# Altium footprint library PcbLib1.PcbLib: 120 footprints (part 5 of 8)
Each footprint in its own frame and in the unit in brackets; x right, y up, seen from the top. Pads: shape width x height; smd on the part's side, far side on the other; paste and mask are expansions set on the pad; w line width, h text height; cw(c..) or ccw(c..) is an arc to the next point about the centre after c.
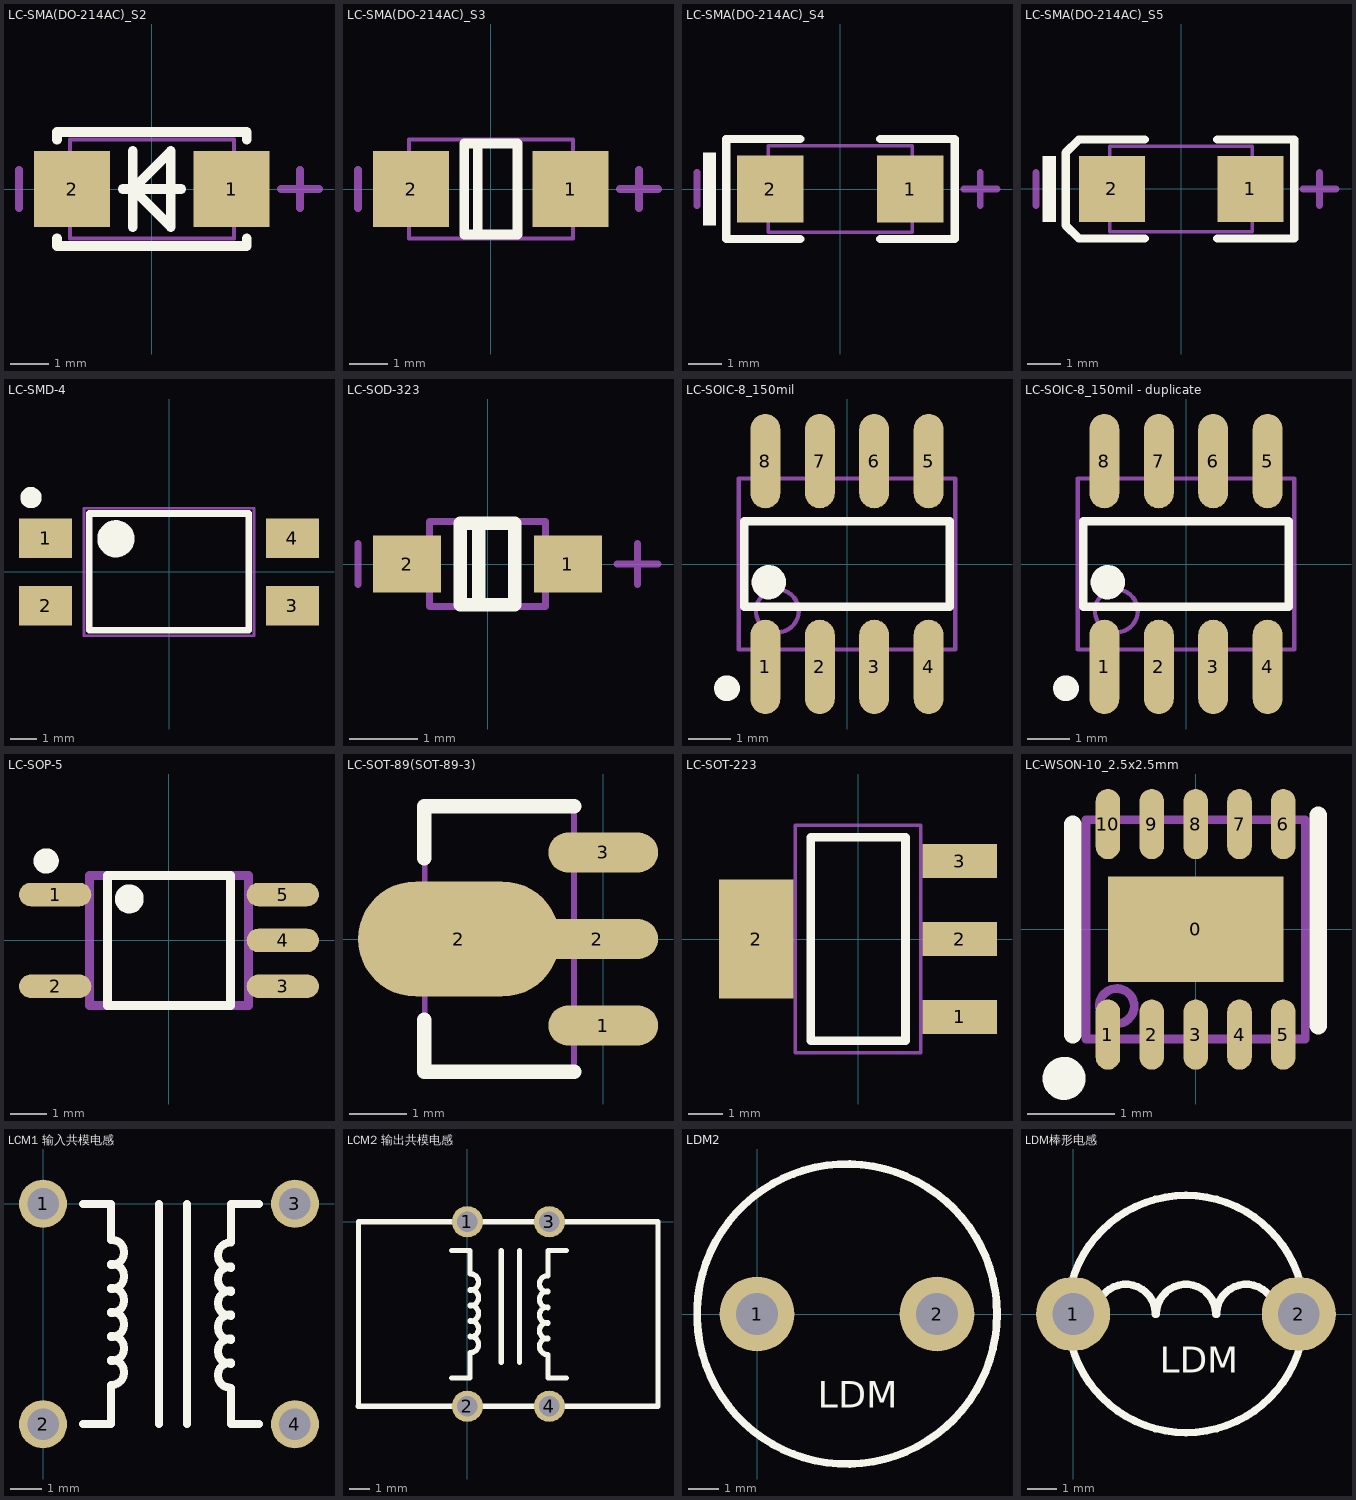
[diagram p4: the footprints below, top view; thin cyan lines are the x and y axes]

## LC-SMA(DO-214AC)_S2 [mm]
pads (2):
  rect 2x2 smd: 1(2.1,0) 2(-2.1,0)
Top Overlay:
  lines w0.254: -2.5,-1.3 -2.5,-1.5 2.5,-1.5 2.5,-1.3 ; -2.5,1.3 -2.5,1.5 2.5,1.5 2.5,1.3 ; -0.77,0 0.77,0 ; -0.5,-1 -0.5,1 ; -0.5,0 0.5,1 0.5,-1 -0.5,0
Mechanical 13:
  lines w0.1: -2.16,-1.3 -2.16,1.3 2.16,1.3 2.16,-1.3 -2.16,-1.3
Mechanical 15:
  lines w0.203: -3.5,-0.5 -3.5,0.5 ; 3.4,0 4.4,0 ; 3.9,-0.5 3.9,0.5

## LC-SMA(DO-214AC)_S3 [mm]
pads (2):
  rect 2x2 smd: 1(2.1,0) 2(-2.1,0)
Top Overlay:
  lines w0.254: -0.35,-1.2 -0.35,1.2 ; -0.7,-1.2 0.7,-1.2 0.7,1.2 -0.7,1.2 -0.7,-1.2
Mechanical 13:
  lines w0.1: -2.16,-1.3 2.16,-1.3 2.16,1.3 -2.16,1.3 -2.16,-1.3
Mechanical 15:
  lines w0.203: -3.5,-0.5 -3.5,0.5 ; 3.4,0 4.4,0 ; 3.9,-0.5 3.9,0.5

## LC-SMA(DO-214AC)_S4 [mm]
pads (2):
  rect 2x2 smd: 1(2.1,0) 2(-2.1,0)
Top Overlay:
  rectangle: -4.125,-1.1 -3.725,1.1
  lines w0.254: -3.43,1.5 -1.2,1.5 ; -3.429,1.5 -3.429,-1.5 -1.199,-1.5 ; 1.201,-1.5 3.431,-1.5 3.431,1.5 1.201,1.5
Mechanical 13:
  lines w0.1: -2.16,-1.3 -2.16,1.3 2.16,1.3 2.16,-1.3 -2.16,-1.3
Mechanical 15:
  lines w0.203: -4.3,-0.5 -4.3,0.5 ; 3.7,0 4.7,0 ; 4.2,-0.5 4.2,0.5

## LC-SMA(DO-214AC)_S5 [mm]
pads (2):
  rect 2x2 smd: 1(2.1,0) 2(-2.1,0)
Top Overlay:
  rectangle: -4.2,-1 -3.8,1
  lines w0.254: -1.1,-1.5 -3.1,-1.5 -3.5,-1.1 -3.5,1.1 -3.1,1.5 -1.1,1.5 ; 1.1,-1.5 3.431,-1.5 3.431,1.5 1.1,1.5
Mechanical 13:
  lines w0.1: -2.16,-1.3 2.16,-1.3 2.16,1.3 -2.16,1.3 -2.16,-1.3
Mechanical 15:
  lines w0.203: -4.4,-0.5 -4.4,0.5 ; 3.7,0 4.7,0 ; 4.2,-0.5 4.2,0.5

## LC-SMD-4 [mm]
pads (4):
  rect 2x1.5 smd: 1(-4.65,1.27) 2(-4.65,-1.27) 3(4.65,-1.27) 4(4.65,1.27)
Top Overlay:
  circle w0.7: c-2,1.25 r0.35
  circle w0.4: c-5.2,2.8 r0.2
  lines w0.254: -3,-2.2 3,-2.2 3,2.2 -3,2.2 -3,-2.2
Mechanical 13:
  lines w0.1: -3.2,-2.4 -3.2,2.4 3.2,2.4 3.2,-2.4 -3.2,-2.4
3D body "User Library-DIP4_opto_iso.STEP": height 3.9, standoff 0, extent -5.015,-2.416 5.015,2.416

## LC-SOD-323 [mm]
pads (2):
  rect 1x0.83 smd: 1(1.18,0) 2(-1.18,0)
Top Overlay:
  lines w0.2: -0.13,-0.6 -0.13,0.6 ; -0.4,-0.6 0.4,-0.6 0.4,0.6 -0.4,0.6 -0.4,-0.6
Mechanical 13:
  lines w0.1: -0.85,-0.625 0.85,-0.625 0.85,0.625 -0.85,0.625 -0.85,-0.625
Mechanical 15:
  lines w0.1: -1.9,-0.3 -1.9,0.3 ; 1.9,0 2.5,0 ; 2.2,-0.3 2.2,0.3
3D body "SOD323.STEP": height 1.1, standoff 0, extent -1.35,-0.625 1.35,0.625

## LC-SOIC-8_150mil [mm]
pads (8):
  oval 0.7x2.2 smd: 1(-1.905,-2.4) 2(-0.635,-2.4) 3(0.635,-2.4) 4(1.905,-2.4) 5(1.905,2.4) 6(0.635,2.4) 7(-0.635,2.4) 8(-1.905,2.4)
Top Overlay:
  circle w0.4: c-1.825,-0.425 r0.2
  circle w0.3: c-2.8,-2.9 r0.15
  lines w0.2: -2.4,-1 -2.4,1 2.4,1 2.4,-1 -2.4,-1
Mechanical 13:
  circle w0.1: c-1.625,-1.095 r0.5
  lines w0.1: -2.525,-1.995 -2.525,1.995 2.525,1.995 2.525,-1.995 -2.525,-1.995

## LC-SOIC-8_150mil - duplicate [mm]
pads (8):
  oval 0.7x2.2 smd: 1(-1.905,-2.4) 2(-0.635,-2.4) 3(0.635,-2.4) 4(1.905,-2.4) 5(1.905,2.4) 6(0.635,2.4) 7(-0.635,2.4) 8(-1.905,2.4)
Top Overlay:
  circle w0.4: c-1.825,-0.425 r0.2
  circle w0.3: c-2.8,-2.9 r0.15
  lines w0.2: -2.4,-1 -2.4,1 2.4,1 2.4,-1 -2.4,-1
Mechanical 13:
  circle w0.1: c-1.625,-1.095 r0.5
  lines w0.1: -2.525,-1.995 -2.525,1.995 2.525,1.995 2.525,-1.995 -2.525,-1.995

## LC-SOP-5 [mm]
pads (5):
  oval 2x0.65 smd: 1(-3.15,1.27) 2(-3.15,-1.27) 3(3.15,-1.27) 4(3.15,0) 5(3.15,1.27)
Top Overlay:
  circle w0.4: c-1.1,1.15 r0.2
  circle w0.4: c-3.4,2.2 r0.15
  lines w0.254: -1.7,-1.8 -1.7,1.8 1.7,1.8 1.7,-1.8 -1.7,-1.8
Mechanical 13:
  lines w0.254: -2.2,-1.8 -2.2,1.8 2.2,1.8 2.2,-1.8 -2.2,-1.8

## LC-SOT-89(SOT-89-3) [mm]
pads (4):
  oval 1.9x0.7 smd: 1(0,-1.5) 3(0,1.5)
  oval 3.5x2 smd: 2(-2.5,0)
  oval 2.1x0.7 smd: 2(-0.1,0)
Top Overlay:
  lines w0.254: -3.1,-1.4 -3.1,-2.3 -0.5,-2.3 ; -3.1,1.4 -3.1,2.3 -0.5,2.3
Mechanical 13:
  lines w0.1: -3.095,-2.3 -0.505,-2.3 -0.505,2.3 -3.095,2.3 -3.095,-2.3
3D body "SOT-89-3.STEP": height 1.51, standoff 0, extent -3.75,-2.25 0.55,2.25

## LC-SOT-223 [mm]
pads (4):
  rect 2.2x1 smd: 1(3,-2.3) 2(3,0) 3(3,2.3)
  rect 2.2x3.5 smd: 2(-3,0)
Top Overlay:
  lines w0.254: -1.4,-3 -1.4,3 1.4,3 1.4,-3 -1.4,-3
Mechanical 13:
  lines w0.1: -1.85,-3.35 1.85,-3.35 1.85,3.35 -1.85,3.35 -1.85,-3.35
3D body "TO-223.STEP": height 1.64, standoff -0.04, extent -3.49,-3.242 3.49,3.243

## LC-WSON-10_2.5x2.5mm [mm]
pads (11):
  rect 2x1.2 smd mask+0.051: 0(0,0)
  oval 0.28x0.8 smd paste-0.025 mask+0.051: 1(-1,-1.2) 2(-0.5,-1.2) 3(0,-1.2) 4(0.5,-1.2) 5(1,-1.2) 6(1,1.2) 7(0.5,1.2) 8(0,1.2) 9(-0.5,1.2) 10(-1,1.2)
Top Overlay:
  circle w0.25: c-1.5,-1.7 r0.12
  lines w0.2: -1.4,-1.2 -1.4,1.2 ; 1.4,-1.1 1.4,1.3
Mechanical 13:
  circle w0.1: c-0.9,-0.875 r0.2
  lines w0.1: -1.25,-1.25 1.25,-1.25 1.25,1.25 -1.25,1.25 -1.25,-1.25

## LCM1 输入共模电感 [mm]
pads (4):
  round 1.524 hole 1: 1(0,0) 2(0,-7) 3(8,0) 4(8,-7)
Top Overlay:
  lines w0.254: 1.27,-6.985 2.159,-6.985 2.159,-5.842 ; 1.27,0 2.159,0 2.159,-1.143 cw(c2.176,-1.543) 2.157,-1.942 ; 2.157,-5.752 ccw(c2.176,-5.353) 2.159,-4.953 ; 2.157,-4.99 ccw(c2.176,-4.591) 2.159,-4.191 ; 2.157,-4.228 ccw(c2.176,-3.829) 2.159,-3.429 ; 2.157,-3.466 ccw(c2.176,-3.067) 2.159,-2.667 ; 2.157,-2.704 ccw(c2.176,-2.305) 2.159,-1.905 ; 3.683,-6.985 3.683,0 ; 4.572,-6.985 4.572,0 ; 5.969,-5.08 cw(c5.952,-4.68) 5.971,-4.281 ; 5.969,-4.318 cw(c5.952,-3.918) 5.971,-3.519 ; 5.969,-3.556 cw(c5.952,-3.156) 5.971,-2.757 ; 5.969,-2.794 cw(c5.952,-2.394) 5.971,-1.995 ; 5.969,-2.032 cw(c5.952,-1.632) 5.971,-1.233 ; 5.969,-1.143 5.969,0 6.858,0 ; 5.971,-5.043 ccw(c5.952,-5.442) 5.969,-5.842 5.969,-6.985 6.858,-6.985

## LCM2 输出共模电感 [mm]
pads (4):
  round 1.524 hole 1: 1(0,0) 2(0,-9) 3(4,0) 4(4,-9)
Top Overlay:
  lines w0.254: -5.334,-9 9.3,-9 9.3,0 -5.3,0 ; -5.316,-9 -5.316,-0.127 ; -0.762,-7.62 0.127,-7.62 0.127,-6.477 ; -0.762,-1.397 0.127,-1.397 0.127,-2.54 cw(c0.144,-2.94) 0.125,-3.339 ; 0.125,-6.387 ccw(c0.144,-5.988) 0.127,-5.588 ; 0.125,-5.625 ccw(c0.144,-5.226) 0.127,-4.826 ; 0.125,-4.863 ccw(c0.144,-4.464) 0.127,-4.064 ; 0.125,-4.101 ccw(c0.144,-3.702) 0.127,-3.302 ; 1.651,-6.858 1.651,-1.397 ; 2.54,-6.858 2.54,-1.397 ; 3.937,-5.715 cw(c3.92,-5.315) 3.939,-4.916 ; 3.937,-4.953 cw(c3.92,-4.553) 3.939,-4.154 ; 3.937,-4.191 cw(c3.92,-3.791) 3.939,-3.392 ; 3.937,-3.429 cw(c3.92,-3.029) 3.939,-2.63 ; 3.937,-2.54 3.937,-1.397 4.826,-1.397 ; 3.939,-5.678 ccw(c3.92,-6.077) 3.937,-6.477 3.937,-7.62 4.826,-7.62

## LDM2 [mm]
pads (2):
  round 2.5 hole 1.4: 1(0,0) 2(6,0)
Top Overlay:
  circle w0.254: c3,0 r5
  text "LDM" at 2.032,-3.429 h1.52

## LDM棒形电感 [mm]
pads (2):
  round 2.5 hole 1.4: 1(0,0) 2(7.62,0)
Top Overlay:
  circle w0.254: c3.81,0 r4
  lines w0.254: 0.778,0 cw(c1.778,0) 2.778,0 ; 2.81,0 cw(c3.81,0) 4.81,0 ; 4.842,0 cw(c5.842,0) 6.842,0
  text "LDM" at 2.921,-2.286 h1.52